# Altium footprint library WallLight.PcbLib: 33 footprints (part 2 of 3)
Each footprint in its own frame and in the unit in brackets; x right, y up, seen from the top. Pads: shape width x height; smd on the part's side, far side on the other; paste and mask are expansions set on the pad; w line width, h text height; cw(c..) or ccw(c..) is an arc to the next point about the centre after c.
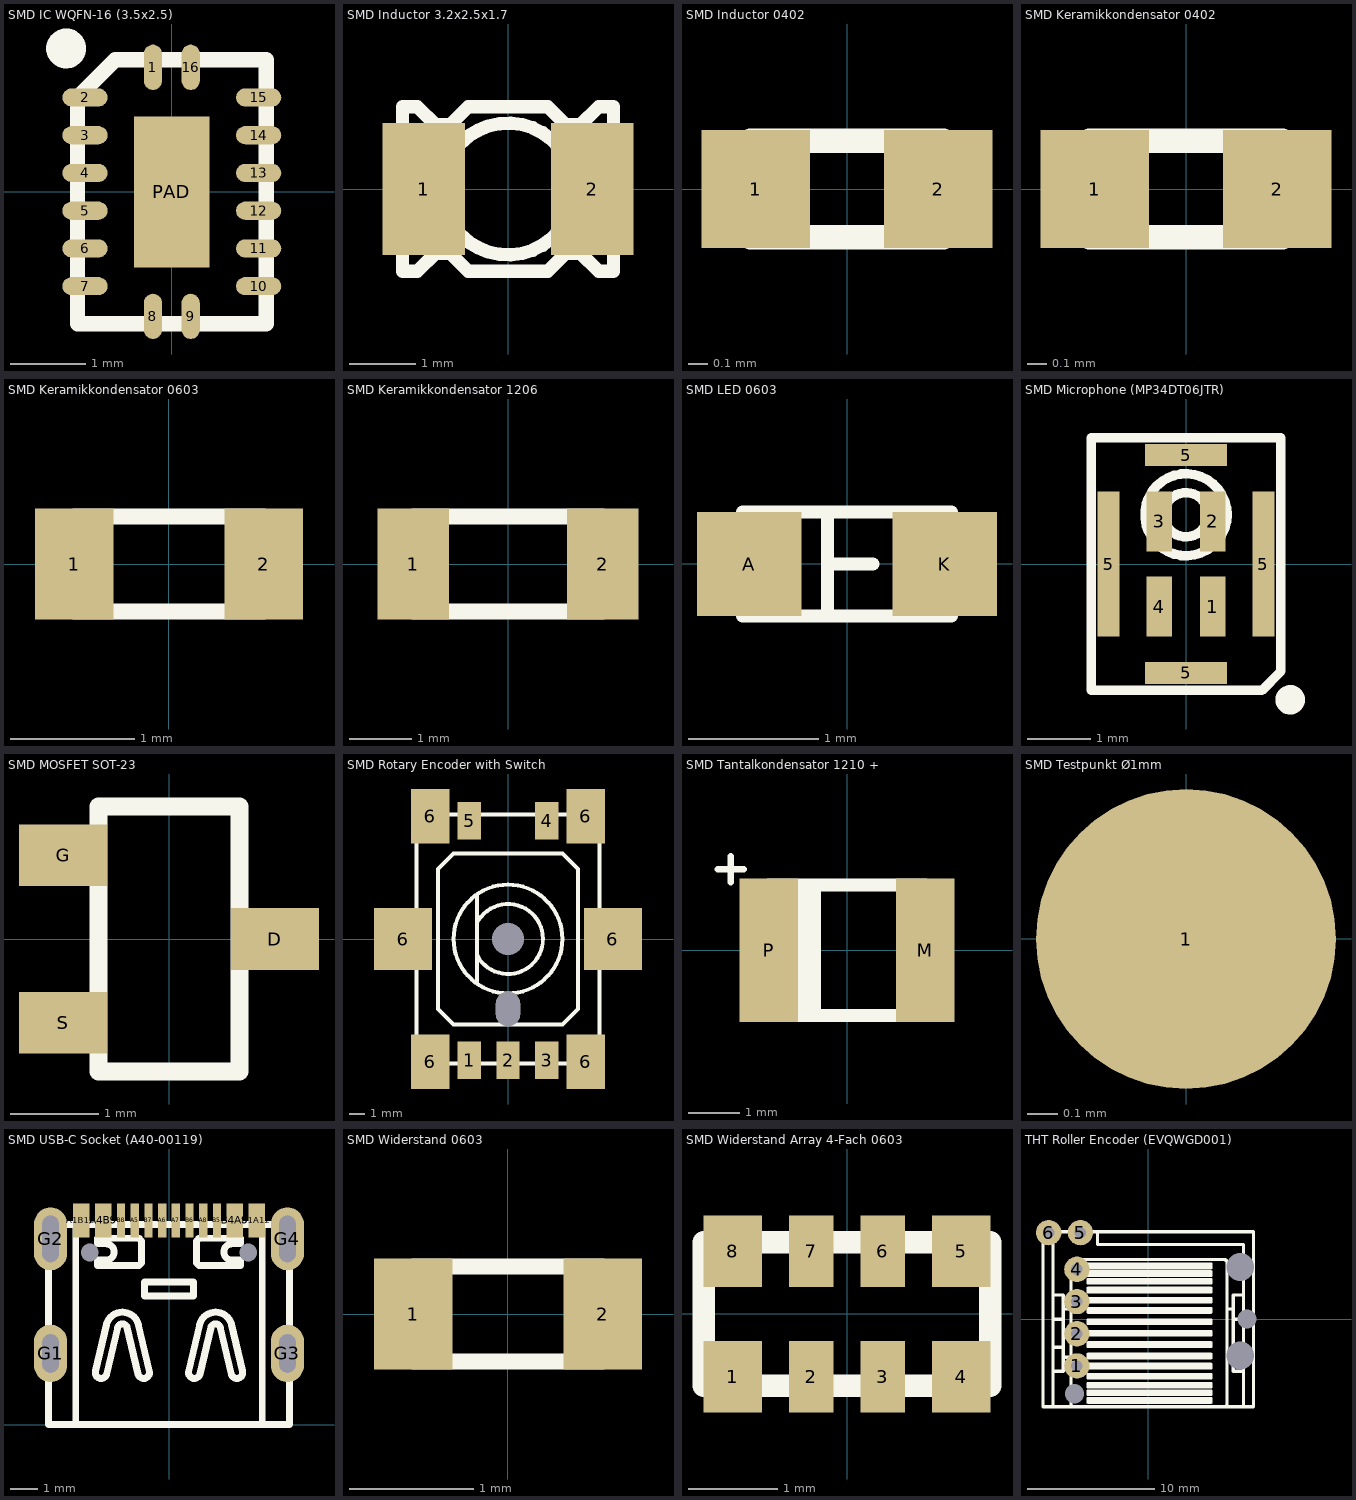
[diagram p1: the footprints below, top view; thin cyan lines are the x and y axes]

## SMD IC WQFN-16 (3.5x2.5) [mm] "QFN, 48-Leads, Body 7x7mm, Pitch 0.5mm, IPC Medium Density"
height 0.9
pads (17):
  oval 0.24x0.6 smd: 1(-0.25,1.65) 8(-0.25,-1.65) 9(0.25,-1.65) 16(0.25,1.65)
  oval 0.6x0.24 smd: 2(-1.15,1.25) 3(-1.15,0.75) 4(-1.15,0.25) 5(-1.15,-0.25) 6(-1.15,-0.75) 7(-1.15,-1.25) 10(1.15,-1.25) 11(1.15,-0.75) 12(1.15,-0.25) 13(1.15,0.25) 14(1.15,0.75) 15(1.15,1.25)
  rect 1x2 smd: PAD(0,0)
Top Overlay:
  circle w0.28: c-1.4,1.9 r0.125
  lines w0.203: -1.25,-1.75 -1.25,1.25 -0.75,1.75 1.25,1.75 1.25,-1.75 -1.25,-1.75
3D body "User Library-WQFN-16.x_t": height 0.82, standoff 0, extent -1.26,-1.76 1.26,1.76

## SMD Inductor 3.2x2.5x1.7 [mm]
pads (2):
  rect 1.25x2 smd: 1(-1.275,0) 2(1.275,0)
Top Overlay:
  circle w0.203: c0,0 r1
  lines w0.203: -1.6,-1.25 -1.375,-1.25 -1.1,-0.975 -0.875,-0.975 -0.6,-1.25 0,-1.25 0.6,-1.25 0.875,-0.975 1.1,-0.975 1.375,-1.25 1.6,-1.25 1.6,1.25 1.375,1.25 1.1,0.975 0.875,0.975 0.6,1.25 0,1.25 -0.6,1.25 -0.875,0.975 -1.1,0.975 -1.375,1.25 -1.6,1.25 -1.6,-1.25
3D body "User Library-LQH32PN_sw.x_b": height 1.55, standoff 0, extent -1.6,-1.25 1.6,1.25

## SMD Inductor 0402 [mm]
pads (2):
  rect 0.57x0.62 smd: 1(-0.48,0) 2(0.48,0)
Top Overlay:
  lines w0.127: -0.508,-0.254 -0.508,0.254 0.508,0.254 0.508,-0.254 -0.508,-0.254
3D body "User Library-FB_1005.STEP": height 0.5, standoff 0, extent -0.5,-0.25 0.5,0.25

## SMD Keramikkondensator 0402 [mm]
pads (2):
  rect 0.57x0.62 smd: 1(-0.48,0) 2(0.48,0)
Top Overlay:
  lines w0.127: -0.508,-0.254 0.508,-0.254 0.508,0.254 -0.508,0.254 -0.508,-0.254
3D body "User Library-0402_Cap.STEP": height 0.51, standoff 0, extent -0.5,-0.25 0.5,0.25

## SMD Keramikkondensator 0603 [mil]
height 66.93
pads (2):
  rect 25x35 smd: 1(-30,0) 2(30,0)
Top Overlay:
  lines w5: -30,-15 30,-15 30,15 -30,15 -30,-15
3D body "User Library-0603_Cap.STEP": height 31.69, standoff 0, extent -31.49,-15.74 31.5,15.75

## SMD Keramikkondensator 1206 [mil]
pads (2):
  rect 45x70 smd: 1(-60,0) 2(60,0)
Top Overlay:
  lines w10: -60,-30 -60,30 60,30 60,-30 -60,-30
3D body "User Library-1206 SMD Capacitor.step": height 39.45, standoff 0, extent -62.98,-31.49 63,31.51

## SMD LED 0603 [mm] "SMD_LED_RED"
height 8.65
pads (2):
  rect 0.8x0.8 smd: A(-0.75,0) K(0.75,0)
Top Overlay:
  lines w0.1: -0.15,-0.4 -0.15,0.4 ; -0.15,0 0.2,0 ; -0.8,-0.4 0.8,-0.4 0.8,0.4 -0.8,0.4 -0.8,-0.4
3D body "User Library-LED SMD0603.step": height 0.68, standoff 0, extent -0.808,-0.368 0.842,0.357

## SMD Microphone (MP34DT06JTR) [mm]
pads (8):
  rect 0.4x0.95 smd: 1(0.425,-0.675) 2(0.425,0.675) 3(-0.425,0.675) 4(-0.425,-0.675)
  rect 0.35x2.3 smd: 5(-1.225,0) 5(1.225,0)
  rect 1.3x0.35 smd: 5(0,-1.725) 5(0,1.725)
Top Overlay:
  circle w0.254: c1.65,-2.15 r0.106
  circle w0.152: c0,0.78 r0.65
  circle w0.152: c0,0.78 r0.35
  lines w0.152: -1.5,-2 -1.5,0 -1.5,2 0,2 1.5,2 1.5,0 1.5,-1.7 1.2,-2 0,-2 -1.5,-2
3D body "User Library-hclga_4l.x_t": height 1.02, standoff 0.01, extent -1.5,-2 1.5,2

## SMD MOSFET SOT-23 [mm]
pads (3):
  rect 1x0.7 smd: D(1.2,0) G(-1.2,0.95) S(-1.2,-0.95)
Top Overlay:
  lines w0.203: -0.8,-1.5 -0.8,1.5 0.8,1.5 0.8,-1.5 -0.8,-1.5
3D body "CircuitWorks-SOT-23.step": height 1.1, standoff 0, extent -1.301,-1.5 1.199,1.5

## SMD Rotary Encoder with Switch [mm]
pads (13):
  rect 1.5x2.4 smd: 1(-2.5,-7.8) 2(0,-7.8) 3(2.5,-7.8) 4(2.5,7.6) 5(-2.5,7.6)
  rect 3.75x4 smd: 6(-6.75,0) 6(6.75,0)
  rect 2.5x3.5 smd: 6(-5,-7.9) 6(-5,7.9) 6(5,-7.9) 6(5,7.9)
  round 0 hole 1.55 slot 2.2 at 90 deg unplated: NC(0,-4.5)
  round 0 hole 2.05 unplated: NC(0,0)
Top Overlay:
  circle w0.254: c0,0 r3.5
  lines w0.254: -2.002,1.026 cw(c0,0) -1.992,-1.046 ; -2,-2.8 -2,2.8 ; -5.9,-8 -5.9,8 5.9,8 5.9,-8 -5.9,-8 ; -4.5,-4.5 -3.5,-5.5 0,-5.5 3.5,-5.5 4.5,-4.5 4.5,0 4.5,4.5 3.5,5.5 0,5.5 -3.5,5.5 -4.5,4.5 -4.5,0 -4.5,-4.5
3D body "70408639.x_t": height 14.2, standoff -1.1, extent -7.5,-9 7.5,9

## SMD Tantalkondensator 1210 + [mil]
pads (2):
  rect 45x110 smd: M(60,0) P(-60,0)
Top Overlay:
  rectangle: -60,-50 -20,50
  lines w5: -99,62 -79,62 ; -89,52 -89,72
  lines w10: -60,-50 60,-50 60,50 -60,50 -60,-50
3D body "User Library-AVX_BCASE.x_b": height 79.92, standoff 0, extent -72.83,-57.67 72.84,57.68

## SMD Testpunkt Ø1mm [mm]
pads (1):
  round 1 smd: 1(0,0)

## SMD USB-C Socket (A40-00119) [mm]
pads (18):
  rect 0.6x1.25 smd: A1B12(-3.2,7.45) A4B9(-2.4,7.45) B1A12(3.2,7.45) B4A9(2.4,7.45)
  rect 0.3x1.25 smd: A5(-1.25,7.45) A6(-0.25,7.45) A7(0.25,7.45) A8(1.25,7.45) B5(1.75,7.45) B6(0.75,7.45) B7(-0.75,7.45) B8(-1.75,7.45)
  oval 1.2x2.1 hole 0.6 slot 1.4 at 90 deg: G1(-4.32,2.6) G3(4.32,2.6)
  oval 1.2x2.3 hole 0.6 slot 1.7 at 90 deg: G2(-4.32,6.78) G4(4.32,6.78)
  round 0 hole 0.65 unplated: NC(-2.89,6.28) NC(2.89,6.28)
Top Overlay:
  lines w0.254: -3.5,0 -3.4,0 -3.4,7.3 ; 3.4,7.3 3.4,0 3.5,0 ; -4.4,0 -4.375,0 0,0 4.375,0 4.4,0 4.4,7.3 0,7.3 -4.4,7.3 -4.4,0 ; -2.68,1.965 ccw(c-2.476,1.902) -2.27,1.85 -1.871,3.547 cw(c-1.7,3.5) -1.7,3.677 cw(c-1.7,3.5) -1.529,3.547 -1.13,1.85 ccw(c-0.924,1.902) -0.72,1.965 -1.12,3.662 ccw(c-1.7,3.5) -1.7,4.102 ccw(c-1.7,3.5) -2.28,3.662 -2.68,1.965 ; -2.6,5.8 -2.6,6 -2.3,6 ccw(c-2.3,6.3) -2,6.3 ccw(c-2.3,6.3) -2.3,6.6 -2.6,6.6 -2.6,6.8 -1.1,6.8 -1,6.7 -1,5.9 -1.1,5.8 -2.6,5.8 ; -0.9,4.7 -0.9,5.2 0,5.2 0.9,5.2 0.9,4.7 0,4.7 -0.9,4.7 ; 0.72,1.965 ccw(c0.924,1.902) 1.13,1.85 1.529,3.547 cw(c1.7,3.5) 1.7,3.677 cw(c1.7,3.5) 1.871,3.547 2.27,1.85 ccw(c2.476,1.902) 2.68,1.965 2.28,3.662 ccw(c1.7,3.5) 1.7,4.102 ccw(c1.7,3.5) 1.12,3.662 0.72,1.965 ; 1,5.9 1.1,5.8 2.6,5.8 2.6,6 2.3,6 cw(c2.3,6.3) 2,6.3 cw(c2.3,6.3) 2.3,6.6 2.6,6.6 2.6,6.8 1.1,6.8 1,6.7 1,5.9
3D body "USB - C.x_t": height 3.26, standoff -1, extent -4.475,0 4.475,7.75

## SMD Widerstand 0603 [mil]
height 66.93
pads (2):
  rect 25x35 smd: 1(-30,0) 2(30,0)
Top Overlay:
  lines w5: -30,-15 30,-15 30,15 -30,15 -30,-15
3D body "User Library-Panasonic0603.step": height 17.72, standoff 0, extent -31.5,-16.14 31.5,16.14

## SMD Widerstand Array 4-Fach 0603 [mm]
pads (8):
  rect 0.65x0.8 smd: 1(-1.275,-0.7) 4(1.275,-0.7) 5(1.275,0.7) 8(-1.275,0.7)
  rect 0.5x0.8 smd: 2(-0.4,-0.7) 3(0.4,-0.7) 6(0.4,0.7) 7(-0.4,0.7)
Top Overlay:
  lines w0.254: -1.6,-0.8 1.6,-0.8 1.6,0.8 -1.6,0.8 -1.6,-0.8
3D body "User Library-R-0603-Array-4-1.step": height 0.51, standoff -0.01, extent -1.6,-0.8 1.6,0.8

## THT Roller Encoder (EVQWGD001) [mm]
pads (10):
  round 2 hole 0.9: 1(-5.625,-3.685) 2(-5.625,-1.145) 3(-5.625,1.395) 4(-5.625,3.935) 5(-5.35,6.825) 6(-7.85,6.825)
  round 0 hole 1.5 unplated: NC(-5.8,-5.875)
  rect 0x0 hole 2.2 square unplated: NC(7.25,-2.85) NC(7.25,4.125)
  round 0 hole 1.5 square unplated: NC(7.8,0)
Top Overlay:
  drawing of 44 lines, arcs and shapes, not listed
3D body "Encoder.x_t": height 13.3, standoff -3.45, extent -8.3,-6.925 8.3,6.925